# Altium footprint library main.PcbLib: 208 footprints (part 2 of 13)
Each footprint in its own frame and in the unit in brackets; x right, y up, seen from the top. Pads: shape width x height; smd on the part's side, far side on the other; paste and mask are expansions set on the pad; w line width, h text height; cw(c..) or ccw(c..) is an arc to the next point about the centre after c.
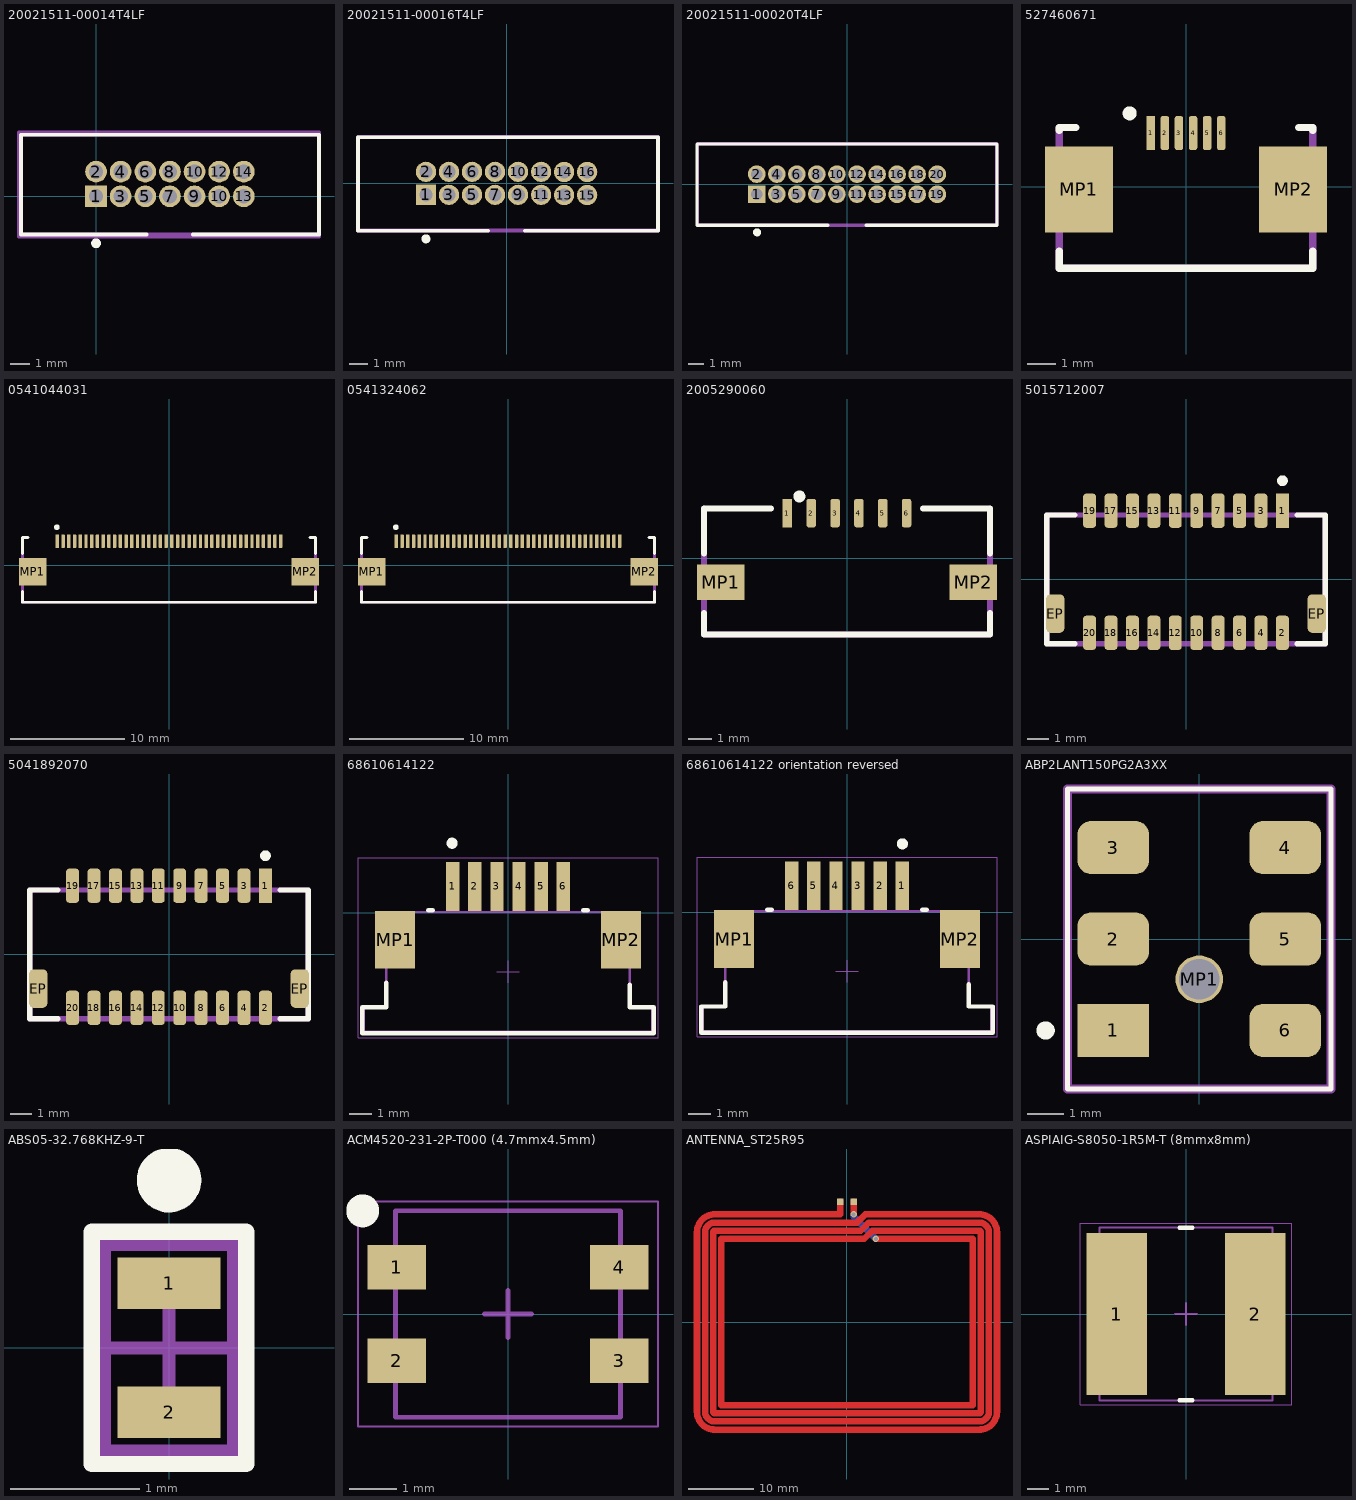
[diagram p1: the footprints below, top view; thin cyan lines are the x and y axes]

## 20021511-00014T4LF [mm] "20021511-00014T4LF"
height 5.4
pads (14):
  rect 1.12x1.12 hole 0.74 paste-1000 mask+0: 1(0,0)
  round 1.12 hole 0.74 paste-1000 mask+0: 2(0,1.27) 3(1.27,0) 4(1.27,1.27) 5(2.54,0) 6(2.54,1.27) 7(3.81,0) 8(3.81,1.27) 9(5.08,0) 10(5.08,1.27) 10(6.35,0) 12(6.35,1.27) 13(7.62,0) 14(7.62,1.27)
Top Overlay:
  circle w0.25: c0,-2.425 r0.125
  lines w0.2: 2.61,-1.97 -3.875,-1.97 -3.875,3.175 11.5,3.175 11.5,-1.97 5.01,-1.97
Mechanical 7:
  text ".Designator" at -1.695,-0.541 h1.52
Mechanical 13:
  lines w0.2: -3.875,-1.97 -3.875,3.175 11.5,3.175 11.5,-1.97 -3.875,-1.97
Mechanical 15:
  lines w0.2: -3.975,-2.07 -3.975,3.3 11.5,3.3 11.5,-2.07 -3.975,-2.07
3D body "20021511-00014XXLFc.stp": height 5.4, standoff -2.3, extent -3.8,-1.9 11.39,3.2

## 20021511-00016T4LF [mm] "20021511-00016T4LF"
height 5.4
pads (16):
  rect 1.12x1.12 hole 0.74 paste-1000 mask+0: 1(-4.445,-0.632)
  round 1.12 hole 0.74 paste-1000 mask+0: 2(-4.445,0.638) 3(-3.175,-0.632) 4(-3.175,0.638) 5(-1.905,-0.632) 6(-1.905,0.638) 7(-0.635,-0.632) 8(-0.635,0.638) 9(0.635,-0.632) 10(0.635,0.638) 11(1.905,-0.632) 12(1.905,0.638) 13(3.175,-0.638) 14(3.175,0.632) 15(4.445,-0.638) 16(4.445,0.632)
Top Overlay:
  circle w0.25: c-4.445,-3.057 r0.125
  lines w0.2: -1,-2.602 -8.195,-2.602 -8.195,2.543 8.355,2.543 8.355,-2.602 1,-2.602
Mechanical 7:
  text ".Designator" at -6.139,-1.172 h1.52
Mechanical 13:
  lines w0.2: -8.195,-2.602 -8.195,2.543 8.355,2.543 8.355,-2.602 -8.195,-2.602
Mechanical 15:
  lines w0.2: -8.195,-2.582 -8.195,2.568 8.355,2.568 8.355,-2.582 -8.195,-2.582
3D body "20021511-00016XXLFc.stp": height 5.4, standoff -2.3, extent -8.195,-2.532 8.265,2.568

## 20021511-00020T4LF [mm] "20021511-00020T4LF"
height 5.4
pads (20):
  rect 1.12x1.12 hole 0.74 paste-1000 mask+0: 1(-5.715,-0.632)
  round 1.12 hole 0.74 paste-1000 mask+0: 2(-5.715,0.638) 3(-4.445,-0.632) 4(-4.445,0.638) 5(-3.175,-0.632) 6(-3.175,0.638) 7(-1.905,-0.632) 8(-1.905,0.638) 9(-0.635,-0.632) 10(-0.635,0.638) 11(0.635,-0.632) 12(0.635,0.638) 13(1.905,-0.638) 14(1.905,0.632) 15(3.175,-0.638) 16(3.175,0.632) 17(4.445,-0.638) 18(4.445,0.632) 19(5.715,-0.638) 20(5.715,0.632)
Top Overlay:
  circle w0.25: c-5.7,-3.05 r0.125
  lines w0.2: -9.5,-2.602 -9.5,2.543 ; -9.465,-2.602 -1.2,-2.602 ; -9.465,2.543 9.485,2.543 ; 1.2,-2.602 9.485,-2.602 ; 9.5,-2.602 9.5,2.543
Mechanical 7:
  text ".Designator" at -7.409,-1.172 h1.52
Mechanical 13:
  lines w0.2: -9.465,-2.602 -9.465,2.543 9.485,2.543 9.485,-2.602 -9.465,-2.602
Mechanical 15:
  lines w0.2: -9.465,-2.582 -9.465,2.568 9.485,2.568 9.485,-2.582 -9.465,-2.582
3D body "20021511-00020XXLFc.stp": height 5.4, standoff -2.3, extent -9.515,-2.532 9.485,2.568

## 527460671 [mm] "527460671"
pads (8):
  rect 0.3x1.2 smd: 1(-1.25,1.9)
  rrect50% 0.3x1.2 smd: 2(-0.75,1.9) 3(-0.25,1.9) 4(0.25,1.9) 5(0.75,1.9) 6(1.25,1.9)
  rect 2.4x3.05 smd: MP1(-3.8,-0.1) MP2(3.8,-0.1)
Top Overlay:
  circle w0.25: c-2,2.6 r0.125
  lines w0.254: -4.5,-2.3 -4.5,-2.9 4.5,-2.9 4.5,-2.3 ; -4.5,2 -4.5,2.1 -3.9,2.1 ; 4,2.1 4.5,2.1 4.5,2
Mechanical 7:
  text ".Designator" at -5.779,-3.111 h1.52
Mechanical 15:
  lines w0.254: -4.5,2.1 -4.5,-2.9 4.5,-2.9 4.5,2.1
3D body "527460671.stp": height 2, standoff -0.02, extent -4.55,-2.9 4.55,2.1

## 0541044031 [mm] "0541044031"
pads (42):
  rect 0.3x1.2 smd: 1(-9.75,2.075)
  rrect50% 0.3x1.2 smd: 2(-9.25,2.075) 3(-8.75,2.075) 4(-8.25,2.075) 5(-7.75,2.075) 6(-7.25,2.075) 7(-6.75,2.075) 8(-6.25,2.075) 9(-5.75,2.075) 10(-5.25,2.075) 11(-4.75,2.075) 12(-4.25,2.075) 13(-3.75,2.075) 14(-3.25,2.075) 15(-2.75,2.075) 16(-2.25,2.075) 17(-1.75,2.075) 18(-1.25,2.075) 19(-0.75,2.075) 20(-0.25,2.075) 21(0.25,2.075) 22(0.75,2.075) 23(1.25,2.075) 24(1.75,2.075) 25(2.25,2.075) 26(2.75,2.075) 27(3.25,2.075) 28(3.75,2.075) 29(4.25,2.075) 30(4.75,2.075) 31(5.25,2.075) 32(5.75,2.075) 33(6.25,2.075) 34(6.75,2.075) 35(7.25,2.075) 36(7.75,2.075) 37(8.25,2.075) 38(8.75,2.075) 39(9.25,2.075) 40(9.75,2.075)
  rect 2.4x2.4 smd: MP1(-11.9,-0.6) MP2(11.9,-0.6)
Top Overlay:
  circle w0.25: c-9.8,3.3 r0.125
  lines w0.254: -12.8,-3.25 -12.8,-2.3 ; -12.8,1 -12.8,2.4 -12.3,2.4 ; -12.794,-3.25 12.8,-3.25 12.8,-2.3 ; 12.3,2.4 12.8,2.4 12.8,1
Mechanical 7:
  text ".Designator" at -5.779,-3.111 h1.52
Mechanical 15:
  lines w0.254: -12.8,2.25 -12.8,-3.25 12.8,-3.25 12.8,2.25
3D body "541044031.stp": height 2, standoff -0.05, extent -12.75,-3.3 12.75,2.3

## 0541324062 [mm] "0541324062"
pads (42):
  rect 0.3x1.2 smd: 1(-9.75,2.075)
  rrect50% 0.3x1.2 smd: 2(-9.25,2.075) 3(-8.75,2.075) 4(-8.25,2.075) 5(-7.75,2.075) 6(-7.25,2.075) 7(-6.75,2.075) 8(-6.25,2.075) 9(-5.75,2.075) 10(-5.25,2.075) 11(-4.75,2.075) 12(-4.25,2.075) 13(-3.75,2.075) 14(-3.25,2.075) 15(-2.75,2.075) 16(-2.25,2.075) 17(-1.75,2.075) 18(-1.25,2.075) 19(-0.75,2.075) 20(-0.25,2.075) 21(0.25,2.075) 22(0.75,2.075) 23(1.25,2.075) 24(1.75,2.075) 25(2.25,2.075) 26(2.75,2.075) 27(3.25,2.075) 28(3.75,2.075) 29(4.25,2.075) 30(4.75,2.075) 31(5.25,2.075) 32(5.75,2.075) 33(6.25,2.075) 34(6.75,2.075) 35(7.25,2.075) 36(7.75,2.075) 37(8.25,2.075) 38(8.75,2.075) 39(9.25,2.075) 40(9.75,2.075)
  rect 2.4x2.4 smd: MP1(-11.9,-0.6) MP2(11.9,-0.6)
Top Overlay:
  circle w0.25: c-9.8,3.3 r0.125
  lines w0.254: -12.8,-3.25 -12.8,-2.3 ; -12.8,1 -12.8,2.4 -12.3,2.4 ; -12.794,-3.25 12.8,-3.25 12.8,-2.3 ; 12.3,2.4 12.8,2.4 12.8,1
Mechanical 7:
  text ".Designator" at -5.779,-3.111 h1.52
Mechanical 15:
  lines w0.254: -12.8,2.25 -12.8,-3.25 12.8,-3.25 12.8,2.25
3D body "541324062.stp": height 2, standoff -0.05, extent -12.75,-3.25 12.75,2.35

## 2005290060 [mm] "2005290060"
pads (8):
  rect 0.4x1.2 smd: 1(-2.5,1.9)
  rrect50% 0.4x1.2 smd: 2(-1.5,1.9) 3(-0.5,1.9) 4(0.5,1.9) 5(1.5,1.9) 6(2.5,1.9)
  rect 2x1.5 smd: MP1(-5.3,-1) MP2(5.3,-1)
Top Overlay:
  circle w0.25: c-2,2.6 r0.125
  lines w0.254: -6,-2.3 -6,-3.2 6,-3.2 6,-2.3 ; -6,0.2 -6,2.1 -3.2,2.1 ; 3.2,2.1 6,2.1 6,0.2
Mechanical 7:
  text ".Designator" at -5.779,-3.111 h1.52
Mechanical 15:
  lines w0.254: -6,2.1 -6,-3.2 6,-3.2 6,2.1
3D body "2005290060.stp": height 1.88, standoff -0.08, extent -6,-3.25 6,2.05

## 5015712007 [mm] "5015712007"
pads (22):
  rect 0.6x1.6 smd: 1(4.5,3.2)
  rrect50% 0.6x1.6 smd: 2(4.5,-2.5) 3(3.5,3.2) 4(3.5,-2.5) 5(2.5,3.2) 6(2.5,-2.5) 7(1.5,3.2) 8(1.5,-2.5) 9(0.5,3.2) 10(0.5,-2.5) 11(-0.5,3.2) 12(-0.5,-2.5) 13(-1.5,3.2) 14(-1.5,-2.5) 15(-2.5,3.2) 16(-2.5,-2.5) 17(-3.5,3.2) 18(-3.5,-2.5) 19(-4.5,3.2) 20(-4.5,-2.5)
  rrect50% 0.85x1.8 smd: EP(-6.1,-1.6) EP(6.1,-1.6)
Top Overlay:
  circle w0.25: c4.5,4.6 r0.125
  lines w0.254: -5.2,-3 -6.5,-3 -6.5,3 -5.2,3 ; 5.2,-3 6.5,-3 6.5,3 5.2,3
Mechanical 7:
  text ".Designator" at -4.1,-0.5 h1.52
Mechanical 15:
  lines w0.254: -6.5,-3 6.5,-3 6.5,3 -6.5,3 -6.5,-3
3D body "5015712007.stp": height 8.23, standoff -0.02, extent -6.5,-2.95 6.5,3.55

## 5041892070 [mm] "5041892070"
pads (22):
  rect 0.6x1.6 smd: 1(4.5,3.2)
  rrect50% 0.6x1.6 smd: 2(4.5,-2.5) 3(3.5,3.2) 4(3.5,-2.5) 5(2.5,3.2) 6(2.5,-2.5) 7(1.5,3.2) 8(1.5,-2.5) 9(0.5,3.2) 10(0.5,-2.5) 11(-0.5,3.2) 12(-0.5,-2.5) 13(-1.5,3.2) 14(-1.5,-2.5) 15(-2.5,3.2) 16(-2.5,-2.5) 17(-3.5,3.2) 18(-3.5,-2.5) 19(-4.5,3.2) 20(-4.5,-2.5)
  rrect50% 0.85x1.8 smd: EP(-6.1,-1.6) EP(6.1,-1.6)
Top Overlay:
  circle w0.25: c4.5,4.6 r0.125
  lines w0.254: -5.2,-3 -6.5,-3 -6.5,3 -5.2,3 ; 5.2,-3 6.5,-3 6.5,3 5.2,3
Mechanical 7:
  text ".Designator" at -4.1,-0.5 h1.52
Mechanical 15:
  lines w0.254: -6.5,-3 -6.5,3 6.5,3 6.5,-3 -6.5,-3
3D body "5018762040.stp": height 8.4, standoff -3.1, extent -10.5,-5.925 11.5,8.575

## 68610614122 [mm] "ZIF Connectors, Horizontal, Top Contact, pitch 1mm, 6p"
height 3.15
pads (8):
  rect 0.6x2.2 smd: 1(-2.5,1.2) 2(-1.5,1.2) 3(-0.5,1.2) 4(0.5,1.2) 5(1.5,1.2) 6(2.5,1.2)
  rect 1.8x2.6 smd: MP1(-5.1,-1.2) MP2(5.1,-1.2)
Top Overlay:
  circle w0.25: c-2.527,3.151 r0.125
  lines w0.2: -5.5,-3.15 -5.5,-4.25 -6.575,-4.25 -6.575,-5.425 6.575,-5.425 6.575,-4.25 5.5,-4.25 5.5,-3.25 ; -3.6,0.125 -3.4,0.125 ; 3.4,0.125 3.6,0.125
Mechanical 7:
  text ".Designator" at -4.562,-3.596 h1.52
Mechanical 13:
  lines w0.1: -6.5,-5.35 -6.5,-4.25 -5.5,-4.25 -5.5,0.05 5.5,0.05 5.5,-4.25 6.5,-4.25 6.5,-5.35 -6.5,-5.35
Mechanical 15:
  lines w0.05: -0.5,-2.65 0.5,-2.65 ; 0,-3.15 0,-2.15 ; -6.775,-5.625 6.775,-5.625 6.775,2.5 -6.775,2.5 -6.775,-5.625
3D body "68610614122.stp": height 3.02, standoff 0.02, extent -6.5,-5.35 6.5,1.75

## 68610614122 orientation reversed [mm] "ZIF Connectors, Horizontal, Top Contact, pitch 1mm, 6p"
height 3.15
pads (8):
  rect 0.6x2.2 smd: 1(2.5,1.2) 2(1.5,1.2) 3(0.5,1.2) 4(-0.5,1.2) 5(-1.5,1.2) 6(-2.5,1.2)
  rect 1.8x2.6 smd: MP1(-5.1,-1.2) MP2(5.1,-1.2)
Top Overlay:
  circle w0.25: c2.5,3.1 r0.125
  lines w0.2: -5.5,-3.15 -5.5,-4.25 -6.575,-4.25 -6.575,-5.425 6.575,-5.425 6.575,-4.25 5.5,-4.25 5.5,-3.25 ; -3.6,0.125 -3.4,0.125 ; 3.4,0.125 3.6,0.125
Mechanical 7:
  text ".Designator" at -4.562,-3.596 h1.52
Mechanical 13:
  lines w0.1: -6.5,-5.35 -6.5,-4.25 -5.5,-4.25 -5.5,0.05 5.5,0.05 5.5,-4.25 6.5,-4.25 6.5,-5.35 -6.5,-5.35
Mechanical 15:
  lines w0.05: -0.5,-2.65 0.5,-2.65 ; 0,-3.15 0,-2.15 ; -6.775,-5.625 6.775,-5.625 6.775,2.5 -6.775,2.5 -6.775,-5.625
3D body "68610614122.stp": height 3.02, standoff 0.02, extent -6.5,-5.35 6.5,1.75

## ABP2LANT150PG2A3XX [mm] "ABP2LANT150PG2A3XX"
pads (7):
  rect 1.95x1.45 smd: 1(-2.35,-2.5)
  rrect50% 1.95x1.45 smd: 2(-2.35,0) 3(-2.35,2.5) 4(2.35,2.5) 5(2.35,0) 6(2.35,-2.5)
  round 1.3 hole 1.1: MP1(0,-1.1)
Top Overlay:
  circle w0.25: c-4.2,-2.5 r0.125
  lines w0.127: -3.6,-4.1 3.6,-4.1 3.6,4.1 1.2,4.1 -1.2,4.1 -3.6,4.1 -3.6,-4.1
Mechanical 7:
  text ".Designator" at -2.8,-1 h1.52
Mechanical 15:
  lines w0.254: -3.6,-4.1 -3.6,4.1 3.6,4.1 3.6,-4.1 -3.6,-4.1
3D body: height 1, standoff 0, extent -3.6,-4.1 3.6,4.1
3D body: height 10.6, standoff 0, extent -1.155,-1.158 1.155,1.158
3D body: height 3.6, standoff 0, extent -3.15,-3.65 3.15,3.65

## ABS05-32.768KHZ-9-T [mm] "ABS05-32.768KHZ-9-T"
height 2.5
pads (2):
  rect 0.8x0.4 smd: 1(0,0.5) 2(0,-0.5)
Top Overlay:
  circle w0.25: c0,1.3 r0.125
  lines w0.127: -0.6,-0.9 -0.6,0.9 0.6,0.9 0.6,-0.9 -0.6,-0.9
Mechanical 7:
  text ".Designator" at -0.3,-0.8 h1.52
Mechanical 13:
  lines w0.1: -0.5,-0.8 0.5,-0.8 0.5,0.8 -0.5,0.8 -0.5,-0.8
Mechanical 15:
  lines w0.05: -0.6,-0.9 0.6,-0.9 0.6,0.9 -0.6,0.9 -0.6,-0.9
  lines w0.1: -0.5,0 0.5,0 ; -0.483,0 0.482,0 ; 0,-0.5 0,0.5 ; 0,-0.381 0,0.381
3D body "ABS05.STEP": height 0.5, standoff 0, extent -0.5,-0.8 0.5,0.8

## ACM4520-231-2P-T000 (4.7mmx4.5mm) [mm] "ACM4520-231-2P-T000 (4.7mmx4.5mm)"
height 2
pads (4):
  rect 1.25x0.95 smd: 1(-2.375,1) 2(-2.375,-1) 3(2.375,-1) 4(2.375,1)
Top Overlay:
  circle w0.5: c-3.1,2.2 r0.1
Mechanical 7:
  text ".Designator" at 0.8,-0.4 h1
Mechanical 13:
  lines w0.1: -2.4,-2.2 -2.4,2.2 2.4,2.2 2.4,-2.2 -2.4,-2.2
Mechanical 15:
  lines w0.05: -3.2,-2.4 -3.2,2.4 3.2,2.4 3.2,-2.4 -3.2,-2.4
  lines w0.1: -0.5,0 0.5,0 ; 0,-0.5 0,0.5
3D body: height 2, standoff 0, extent -2.4,-2.2 2.4,2.2

## ANTENNA_ST25R95 [mm] "ANTENNA_ST25R95"
pads (2):
  rect 1x1 smd: 1(-1,18.5) 2(1,18.5)
via 4.426,12.8 diameter 1 hole 0.6
via 1,16.55 diameter 1 hole 0.6
Top Layer:
  lines w1: -1,18.5 -1,16.55 -20.25,16.55 ccw(c-20.25,13.8) -23,13.8 -23,-13.7 ccw(c-20.25,-13.7) -20.25,-16.45 20.25,-16.45 ccw(c20.25,-13.7) 23,-13.7 23,13.8 ccw(c20.25,13.8) 20.25,16.55 2.8,16.55 1.55,15.3 -20.25,15.3 ccw(c-20.25,13.8) -21.75,13.8 -21.75,-13.7 ccw(c-20.25,-13.7) -20.25,-15.2 20.25,-15.2 ccw(c20.25,-13.7) 21.75,-13.7 21.75,13.8 ccw(c20.25,13.8) 20.25,15.3 3.35,15.3 2.1,14.05 -20.25,14.05 ccw(c-20.25,13.8) -20.5,13.8 -20.5,-13.7 ccw(c-20.25,-13.7) -20.25,-13.95 20.25,-13.95 ccw(c20.25,-13.7) 20.5,-13.7 20.5,13.8 ccw(c20.25,13.8) 20.25,14.05 3.9,14.05 2.65,12.8 -19.25,12.8 -19.25,-12.7 19.25,-12.7 19.25,12.8 4.425,12.8 ; 1,16.55 1,18.5
Bottom Layer:
  lines w1: 1,16.215 1,16.55 ; 1.011,16.215 4.436,12.79

## ASPIAIG-S8050-1R5M-T (8mmx8mm) [mm] "ASPIAIG-S8050-1R5M-T (8mmx8mm)"
height 5.2
pads (2):
  rect 2.8x7.5 smd: 1(-3.2,0) 2(3.2,0)
Top Overlay:
  lines w0.2: -0.3,-4 0.3,-4 ; -0.3,4 0.3,4
Mechanical 7:
  text ".Designator" at -2.1,-0.4 h1.52
Mechanical 13:
  lines w0.1: -4,-4 4,-4 4,4 -4,4 -4,-4
Mechanical 15:
  lines w0.05: -4.9,-4.2 4.9,-4.2 4.9,4.2 -4.9,4.2 -4.9,-4.2
  lines w0.1: -0.5,0 0.5,0 ; 0,-0.5 0,0.5
3D body: height 5, standoff 0, extent -4,-4 4,4